# Altium footprint library Libraries_2014_0618.PcbLib: 391 footprints (part 22 of 25)
Each footprint in its own frame and in the unit in brackets; x right, y up, seen from the top. Pads: shape width x height; smd on the part's side, far side on the other; paste and mask are expansions set on the pad; w line width, h text height; cw(c..) or ccw(c..) is an arc to the next point about the centre after c.
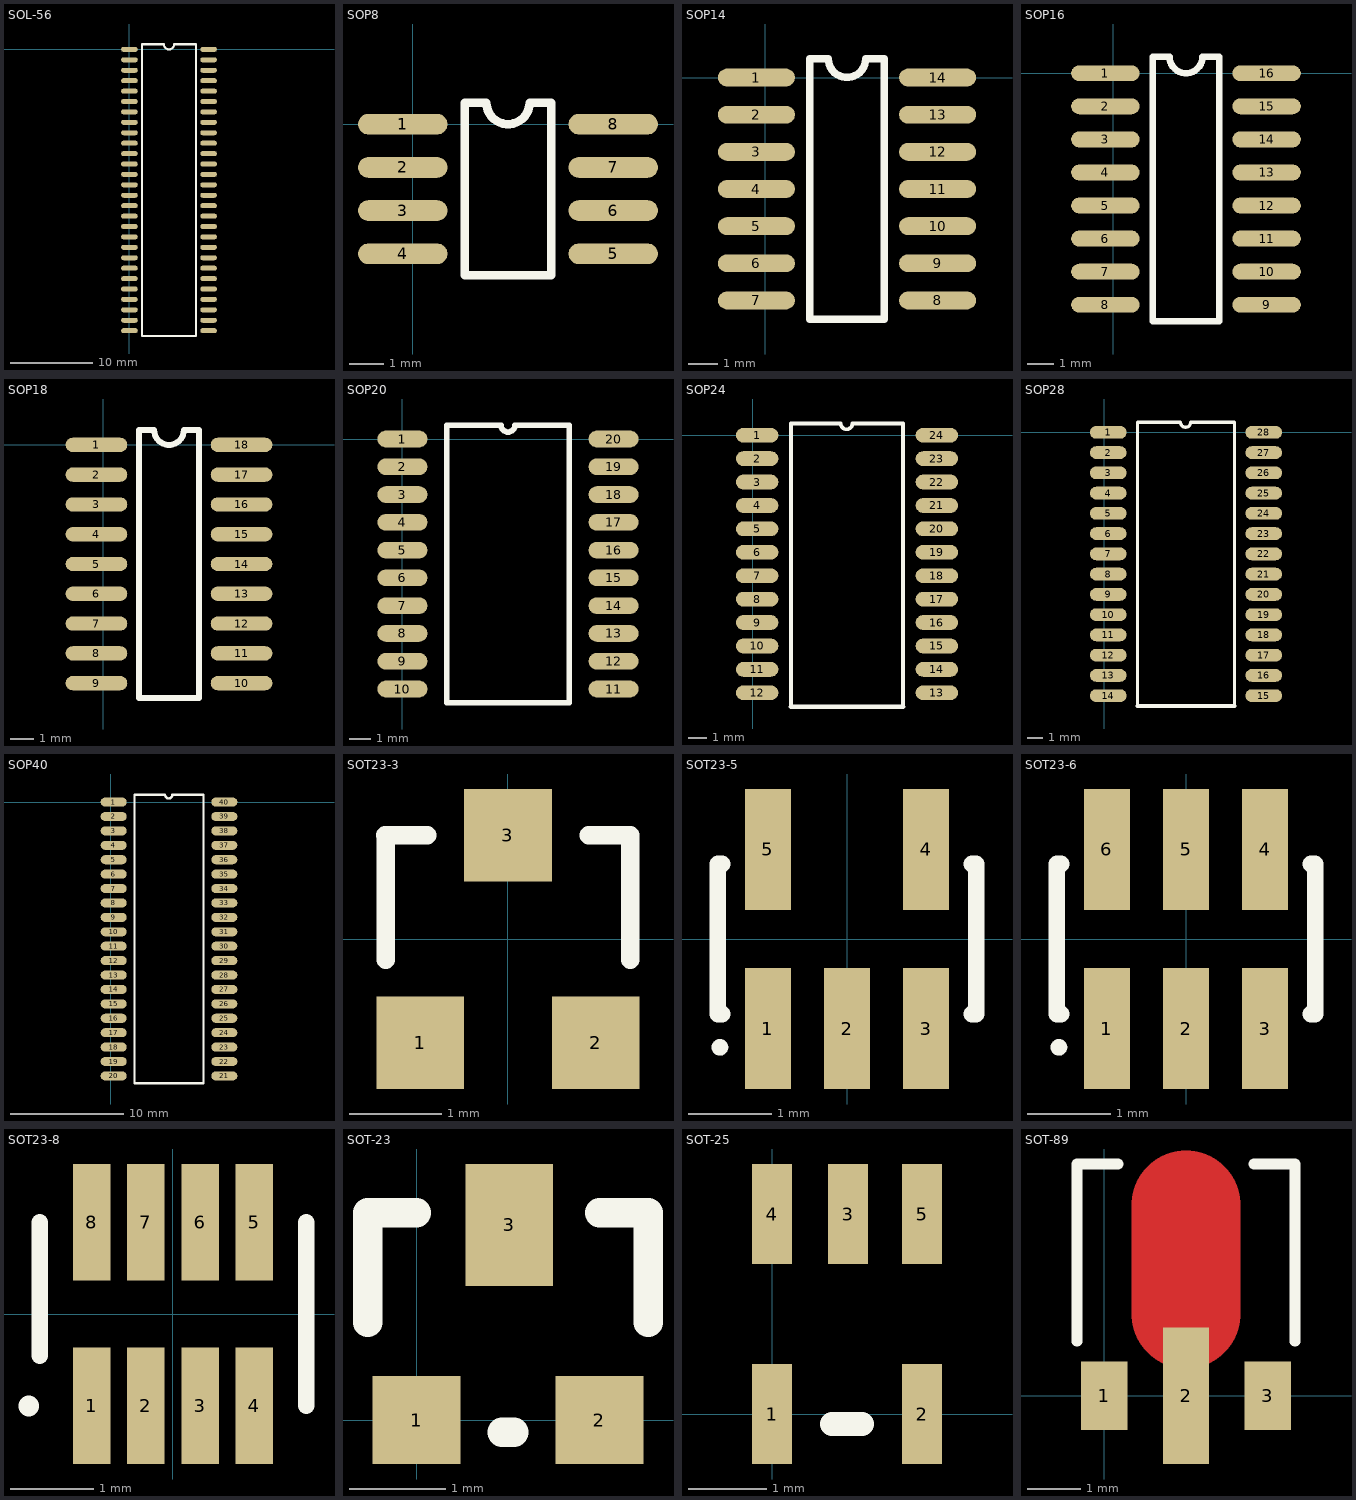
[diagram p21: the footprints below, top view; thin cyan lines are the x and y axes]

## SOL-56 [mil]
pads (56):
  oval 80x24 smd: 1(0,0) 2(0,-50) 3(0,-100) 4(0,-150) 5(0,-200) 6(0,-250) 7(0,-300) 8(0,-350) 9(0,-400) 10(0,-450) 11(0,-500) 12(0,-550) 13(0,-600) 14(0,-650) 15(0,-700) 16(0,-750) 17(0,-800) 18(0,-850) 19(0,-900) 20(0,-950) 21(0,-1000) 22(0,-1050) 23(0,-1100) 24(0,-1150) 25(0,-1200) 26(0,-1250) 27(0,-1300) 28(0,-1350) 29(380,-1350) 30(380,-1300) 31(380,-1250) 32(380,-1200) 33(380,-1150) 34(380,-1100) 35(380,-1050) 36(380,-1000) 37(380,-950) 38(380,-900) 39(380,-850) 40(380,-800) 41(380,-750) 42(380,-700) 43(380,-650) 44(380,-600) 45(380,-550) 46(380,-500) 47(380,-450) 48(380,-400) 49(380,-350) 50(380,-300) 51(380,-250) 52(380,-200) 53(380,-150) 54(380,-100) 55(380,-50) 56(380,0)
Top Overlay:
  lines w10: 60,-1375 60,25 165,25 ccw(c190,25) 215,25 320,25 320,-1375 60,-1375

## SOP8 [mil]
pads (8):
  oval 103.62x24 smd: 1(-11.81,0) 2(-11.81,-50) 3(-11.81,-100) 4(-11.81,-150) 5(231.81,-150) 6(231.81,-100) 7(231.81,-50) 8(231.81,0)
Top Overlay:
  lines w10: 60,-175 160,-175 160,25 135,25 cw(c110,25) 85,25 60,25 60,-175

## SOP14 [mil]
pads (14):
  oval 103.62x24 smd: 1(-11.81,0) 2(-11.81,-50) 3(-11.81,-100) 4(-11.81,-150) 5(-11.81,-200) 6(-11.81,-250) 7(-11.81,-300) 8(231.81,-300) 9(231.81,-250) 10(231.81,-200) 11(231.81,-150) 12(231.81,-100) 13(231.81,-50) 14(231.81,0)
Top Overlay:
  lines w10: 60,-325 60,25 85,25 ccw(c110,25) 135,25 160,25 160,-325 60,-325

## SOP16 [mil]
pads (16):
  oval 103.62x24 smd: 1(-11.81,0) 2(-11.81,-50) 3(-11.81,-100) 4(-11.81,-150) 5(-11.81,-200) 6(-11.81,-250) 7(-11.81,-300) 8(-11.81,-350) 9(231.81,-350) 10(231.81,-300) 11(231.81,-250) 12(231.81,-200) 13(231.81,-150) 14(231.81,-100) 15(231.81,-50) 16(231.81,0)
Top Overlay:
  lines w10: 60,-375 60,25 85,25 ccw(c110,25) 135,25 160,25 160,-375 60,-375

## SOP18 [mil]
pads (18):
  oval 103.62x24 smd: 1(-11.81,0) 2(-11.81,-50) 3(-11.81,-100) 4(-11.81,-150) 5(-11.81,-200) 6(-11.81,-250) 7(-11.81,-300) 8(-11.81,-350) 9(-11.81,-400) 10(231.81,-400) 11(231.81,-350) 12(231.81,-300) 13(231.81,-250) 14(231.81,-200) 15(231.81,-150) 16(231.81,-100) 17(231.81,-50) 18(231.81,0)
Top Overlay:
  lines w10: 60,-425 60,25 85,25 ccw(c110,25) 135,25 160,25 160,-425 60,-425

## SOP20 [mil]
pads (20):
  oval 90x30 smd: 1(0,0) 2(0,-50) 3(0,-100) 4(0,-150) 5(0,-200) 6(0,-250) 7(0,-300) 8(0,-350) 9(0,-400) 10(0,-450) 11(380,-450) 12(380,-400) 13(380,-350) 14(380,-300) 15(380,-250) 16(380,-200) 17(380,-150) 18(380,-100) 19(380,-50) 20(380,0)
Top Overlay:
  lines w10: 80,-475 80,25 177.5,25 ccw(c190,25) 202.5,25 300,25 300,-475 80,-475

## SOP24 [mm]
pads (24):
  oval 2.3x0.8 smd: 1(0.25,0) 2(0.25,-1.27) 3(0.25,-2.54) 4(0.25,-3.81) 5(0.25,-5.08) 6(0.25,-6.35) 7(0.25,-7.62) 8(0.25,-8.89) 9(0.25,-10.16) 10(0.25,-11.43) 11(0.25,-12.7) 12(0.25,-13.97) 13(10,-13.97) 14(10,-12.7) 15(10,-11.43) 16(10,-10.16) 17(10,-8.89) 18(10,-7.62) 19(10,-6.35) 20(10,-5.08) 21(10,-3.81) 22(10,-2.54) 23(10,-1.27) 24(10,0)
Top Overlay:
  lines w0.2: 2.085,-14.732 2.085,0.635 4.782,0.635 ccw(c5.1,0.635) 5.417,0.635 8.115,0.635 ; 8.165,-14.732 8.165,0.635
  lines w0.254: 2.085,-14.732 8.165,-14.732

## SOP28 [mm]
pads (28):
  oval 2.3x0.8 smd: 1(0.25,0) 2(0.25,-1.27) 3(0.25,-2.54) 4(0.25,-3.81) 5(0.25,-5.08) 6(0.25,-6.35) 7(0.25,-7.62) 8(0.25,-8.89) 9(0.25,-10.16) 10(0.25,-11.43) 11(0.25,-12.7) 12(0.25,-13.97) 13(0.25,-15.24) 14(0.25,-16.51) 15(10,-16.51) 16(10,-15.24) 17(10,-13.97) 18(10,-12.7) 19(10,-11.43) 20(10,-10.16) 21(10,-8.89) 22(10,-7.62) 23(10,-6.35) 24(10,-5.08) 25(10,-3.81) 26(10,-2.54) 27(10,-1.27) 28(10,0)
Top Overlay:
  lines w0.2: 2.085,-17.145 2.085,0.635 4.782,0.635 ccw(c5.1,0.635) 5.417,0.635 8.115,0.635 ; 8.165,-17.145 8.165,0.635
  lines w0.254: 2.085,-17.145 8.165,-17.145

## SOP40 [mm]
pads (40):
  oval 2.3x0.8 smd: 1(0.25,0) 2(0.25,-1.27) 3(0.25,-2.54) 4(0.25,-3.81) 5(0.25,-5.08) 6(0.25,-6.35) 7(0.25,-7.62) 8(0.25,-8.89) 9(0.25,-10.16) 10(0.25,-11.43) 11(0.25,-12.7) 12(0.25,-13.97) 13(0.25,-15.24) 14(0.25,-16.51) 15(0.25,-17.78) 16(0.25,-19.05) 17(0.25,-20.32) 18(0.25,-21.59) 19(0.25,-22.86) 20(0.25,-24.13) 21(10,-24.13) 22(10,-22.86) 23(10,-21.59) 24(10,-20.32) 25(10,-19.05) 26(10,-17.78) 27(10,-16.51) 28(10,-15.24) 29(10,-13.97) 30(10,-12.7) 31(10,-11.43) 32(10,-10.16) 33(10,-8.89) 34(10,-7.62) 35(10,-6.35) 36(10,-5.08) 37(10,-3.81) 38(10,-2.54) 39(10,-1.27) 40(10,0)
Top Overlay:
  lines w0.2: 8.115,-24.765 2.085,-24.765 2.085,0.635 4.782,0.635 ccw(c5.1,0.635) 5.417,0.635 8.115,0.635 ; 8.165,-24.765 8.165,0.635

## SOT23-3 [mm] "SOT-23; 3 Leads; Body 3.0 x 2.5 mm, inc. leads (LxW max)"
height 1.2
pads (3):
  rect 0.95x1 smd: 1(-0.95,-1.125) 2(0.95,-1.125) 3(0,1.125)
Top Overlay:
  lines w0.2: -1.328,1.125 -0.875,1.125 ; -1.325,-0.225 -1.325,1.125 ; 0.875,1.125 1.325,1.125 1.325,-0.225

## SOT23-5 [mm] "SOT-23/SC-74A; 5 Leads; Body 3 x 3 mm, inc. leads (LxW max)"
height 1.45
pads (5):
  rect 0.55x1.45 smd: 1(-0.95,-1.075) 2(0,-1.075) 3(0.95,-1.075) 4(0.95,1.075) 5(-0.95,1.075)
Top Overlay:
  circle w0.1: c-1.525,-1.3 r0.05
  lines w0.2: -1.5,-0.9 -1.55,-0.9 -1.55,0.9 -1.5,0.9 ; 1.5,-0.9 1.55,-0.9 1.55,0.9 1.5,0.9

## SOT23-6 [mm] "SOT-457/SC-74; 6 Leads; Body 3 x 3 mm, inc. leads (LxW max)"
height 1.45
pads (6):
  rect 0.55x1.45 smd: 1(-0.95,-1.075) 2(0,-1.075) 3(0.95,-1.075) 4(0.95,1.075) 5(0,1.075) 6(-0.95,1.075)
Top Overlay:
  circle w0.1: c-1.525,-1.3 r0.05
  lines w0.2: -1.5,-0.9 -1.55,-0.9 -1.55,0.9 -1.5,0.9 ; 1.5,-0.9 1.55,-0.9 1.55,0.9 1.5,0.9

## SOT23-8 [mm] "SSOP; 8 Leads; Body Width 1.6 mm; Pitch 0.65 mm"
height 1.45
pads (8):
  rect 0.45x1.4 smd: 1(-0.975,-1.1) 2(-0.325,-1.1) 3(0.325,-1.1) 4(0.975,-1.1) 5(0.975,1.1) 6(0.325,1.1) 7(-0.325,1.1) 8(-0.975,1.1)
Top Overlay:
  lines w0.2: -1.6,-0.5 -1.6,1.1 ; 1.6,-1.1 1.6,1.1
  lines w0.25: -1.73,-1.104 ccw(c-1.75,-1.1) -1.73,-1.1

## SOT-23 [mil]
pads (3):
  rect 36x36 smd: 1(0,0) 2(75,0)
  rect 36x50 smd: 3(38,80)
Top Overlay:
  lines w12: -20,40 -20,85 0,85 ; 35,-5 40,-5 ; 75,85 95,85 95,40

## SOT-25 [mil]
pads (5):
  rect 20x50 smd: 1(0,0) 2(75,0) 3(38,100) 4(0,100) 5(75,100)
Top Overlay:
  lines w12: 30,-5 45,-5

## SOT-89 [mil]
pads (3):
  rect 34x50 smd: 1(0,0) 3(120,0)
  rect 34x100 smd: 2(60,0)
Top Layer:
  lines w80: 60,60 60,140
Top Overlay:
  lines w8: -20,40 -20,170 10,170 ; 110,170 140,170 140,40